# Altium integrated library CC_V1.4.IntLib: 156 symbols (part 1 of 2) (continued)
## KSZ8851SNLI-TR (continued)
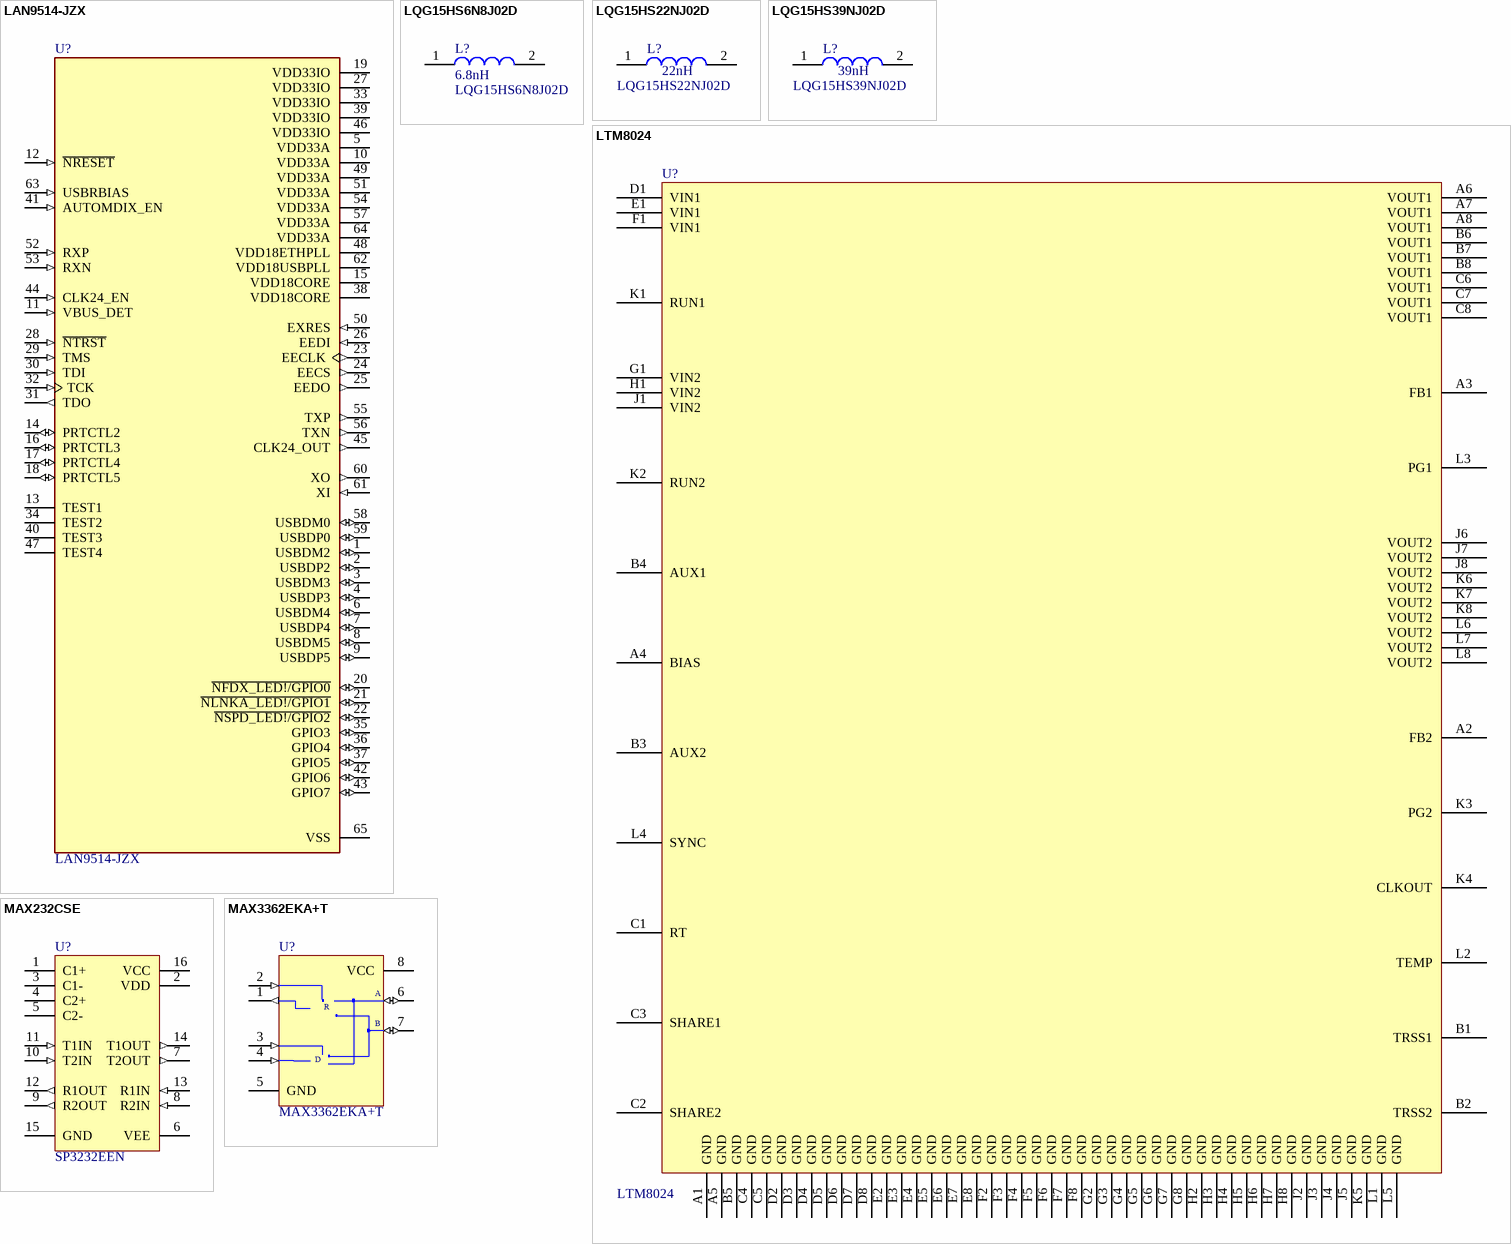
[diagram p3: symbols LAN9514-JZX to MAX3362EKA+T]

## LAN9514-JZX
designator U?
Ethernet Bridge, USB to Ethernet USB 2.0, 10/100 Base-T/TX PHY USB Interface 64-QFN _9x9_; MF: Microchip; MP: LAN9514-JZX; Availability: Unavailable; SnapEDA_Link: https://www.snapeda.com/parts/LAN9514-JZX/Microchip/view-part/105106/?ref=snap; Package: QFN-64 Microchip; Value: *; Price: None
footprint QFN50P900X900X100-65N730X730
pins: 1 USBDM2 (io), 2 USBDP2 (io), 3 USBDM3 (io), 4 USBDP3 (io), 5 VDD33A (power), 6 USBDM4 (io), 7 USBDP4 (io), 8 USBDM5 (io), 9 USBDP5 (io), 10 VDD33A (power), 11 VBUS_DET (in), 12 ~{NRESET} (in), 13 TEST1, 14 PRTCTL2 (io), 15 VDD18CORE (power), 16 PRTCTL3 (io), 17 PRTCTL4 (io), 18 PRTCTL5 (io), 19 VDD33IO (power), 20 ~{NFDX_LED!/GPIO0} (io), 21 ~{NLNKA_LED!/GPIO1} (io), 22 ~{NSPD_LED!/GPIO2} (io), 23 EECLK (out), 24 EECS (out), 25 EEDO (out), 26 EEDI (in), 27 VDD33IO (power), 28 ~{NTRST} (in), 29 TMS (in), 30 TDI (in), 31 TDO (out), 32 TCK (in), 33 VDD33IO (power), 34 TEST2, 35 GPIO3 (io), 36 GPIO4 (io), 37 GPIO5 (io), 38 VDD18CORE (power), 39 VDD33IO (power), 40 TEST3, 41 AUTOMDIX_EN (in), 42 GPIO6 (io), 43 GPIO7 (io), 44 CLK24_EN (in), 45 CLK24_OUT (out), 46 VDD33IO (power), 47 TEST4, 48 VDD18ETHPLL (power), 49 VDD33A (power), 50 EXRES (in), 51 VDD33A (power), 52 RXP (in), 53 RXN (in), 54 VDD33A (power), 55 TXP (out), 56 TXN (out), 57 VDD33A (power), 58 USBDM0 (io), 59 USBDP0 (io), 60 XO (out), 61 XI (in), 62 VDD18USBPLL (power), 63 USBRBIAS (in), 64 VDD33A (power), 65 VSS (power)

## LQG15HS6N8J02D
designator L?  value 6.8nH  (hidden comment: LQG15HS6N8J02D)
Murata Inductor; Manufacturer_Name: Murata Electronics; Height: 0.55mm; Link: https://www.digikey.com/product-detail/en/murata-electronics/LQG15HS6N8J02D/490-2621-1-ND/662901; Part Number: LQG15HS6N8J02D
footprint LQG15HN
pins: 1, 2

## LQG15HS22NJ02D
designator L?  value 22nH  (hidden comment: LQG15HS22NJ02D)
Murata Inductor; Manufacturer_Name: Murata Electronics; Height: 0.55mm; Link: https://www.digikey.com/product-detail/en/murata-electronics/LQG15HS22NJ02D/490-2627-1-ND/662907; Part Number: LQG15HS22NJ02D
footprint LQG15HN
pins: 1, 2

## LQG15HS39NJ02D
designator L?  value 39nH  (hidden comment: LQG15HS39NJ02D)
Murata Inductor; Manufacturer_Name: Murata Electronics; Height: 0.55mm; Link: https://www.digikey.com/product-detail/en/murata-electronics/LQG15HS39NJ02D/490-2630-1-ND/662910; Part Number: LQG15HS39NJ02D
footprint LQG15HN
pins: 1, 2

## LTM8024
designator U?
footprint BGA88C100P8X11_900X1125X352
pins: A1 GND, A2 FB2, A3 FB1, A4 BIAS, A5 GND, A6 VOUT1, A7 VOUT1, A8 VOUT1, B1 TRSS1, B2 TRSS2, B3 AUX2, B4 AUX1, B5 GND, B6 VOUT1, B7 VOUT1, B8 VOUT1, C1 RT, C2 SHARE2, C3 SHARE1, C4 GND, C5 GND, C6 VOUT1, C7 VOUT1, C8 VOUT1, D1 VIN1, D2 GND, D3 GND, D4 GND, D5 GND, D6 GND, D7 GND, D8 GND, E1 VIN1, E2 GND, E3 GND, E4 GND, E5 GND, E6 GND, E7 GND, E8 GND, F1 VIN1, F2 GND, F3 GND, F4 GND, F5 GND, F6 GND, F7 GND, F8 GND, G1 VIN2, G2 GND, G3 GND, G4 GND, G5 GND, G6 GND, G7 GND, G8 GND, H1 VIN2, H2 GND, H3 GND, H4 GND, H5 GND, H6 GND, H7 GND, H8 GND, J1 VIN2, J2 GND, J3 GND, J4 GND, J5 GND, J6 VOUT2, J7 VOUT2, J8 VOUT2, K1 RUN1, K2 RUN2, K3 PG2, K4 CLKOUT, K5 GND, K6 VOUT2, K7 VOUT2, K8 VOUT2, L1 GND, L2 TEMP, L3 PG1, L4 SYNC, L5 GND, L6 VOUT2, L7 VOUT2, L8 VOUT2

## MAX232CSE
designator U?, comment SP3232EEN
IC TXRX RS232 ESD TRUE 16SOIC; Published: 16-Jan-2001; LatestRevisionDate: 13-Apr-2006; LatestRevisionNote: IPC-7351 Footprint Added.; PackageReference: NSO16; Publisher: Altium Limited; PackageDescription: 16-Pin Small Outline Integrated Circuit 1.27 mm Pitch; Code_JEDEC: MS-012-AC; Code_IPC: SOIC127P600-16; ComponentLink1Description: Manufacturer Link; ComponentLink1URL: http://www.maxim-ic.com/; ComponentLink2Description: Datasheet; ComponentLink2URL: http://pdfserv.maxim-ic.com/en/ds/MAX220-MAX249.pdf
footprint SOIC16_M (SOIC, 16-Leads, Body 9.9x3.9mm, Pitch 1.27mm, IPC Low Density)
footprint NSO16_L (SOIC, 16-Leads, Body 9.9x3.9mm, Pitch 1.27mm, IPC High Density)
footprint NSO16_M (SOIC, 16-Leads, Body 9.9x3.9mm, Pitch 1.27mm, IPC Low Density)
3D model NSO16 (16-Pin Small Outline Integrated Circuit 1.27 mm Pitch)
pins: 1 C1+, 2 VDD (power), 3 C1-, 4 C2+, 5 C2-, 6 VEE (power), 7 T2OUT (out), 8 R2IN (in), 9 R2OUT (out), 10 T2IN (in), 11 T1IN (in), 12 R1OUT (out), 13 R1IN (in), 14 T1OUT (out), 15 GND (power), 16 VCC (power)

## MAX3362EKA+T
designator U?, comment Part Number: MAX3362EKA+T  (hidden comment: RS485 Transceiver)
Manufacturer_Name: Maxim Integrated; Datasheet Link: http://docs-emea.rs-online.com/webdocs/0f71/0900766b80f71b05.pdf; Height: 1.45mm; Link: https://www.digikey.sg/product-detail/en/maxim-integrated/MAX3362EKA-T/MAX3362EKA-TCT-ND/9681401
footprint SOT65P280X145-8N (SOT23)
pins: 1 RO (out), 2 ~{RE} (in), 3 DE (in), 4 DI (in), 5 GND (power), 6 A (io), 7 B (io), 8 VCC (power)
2 alternate drawings of the same symbol
text: R; D

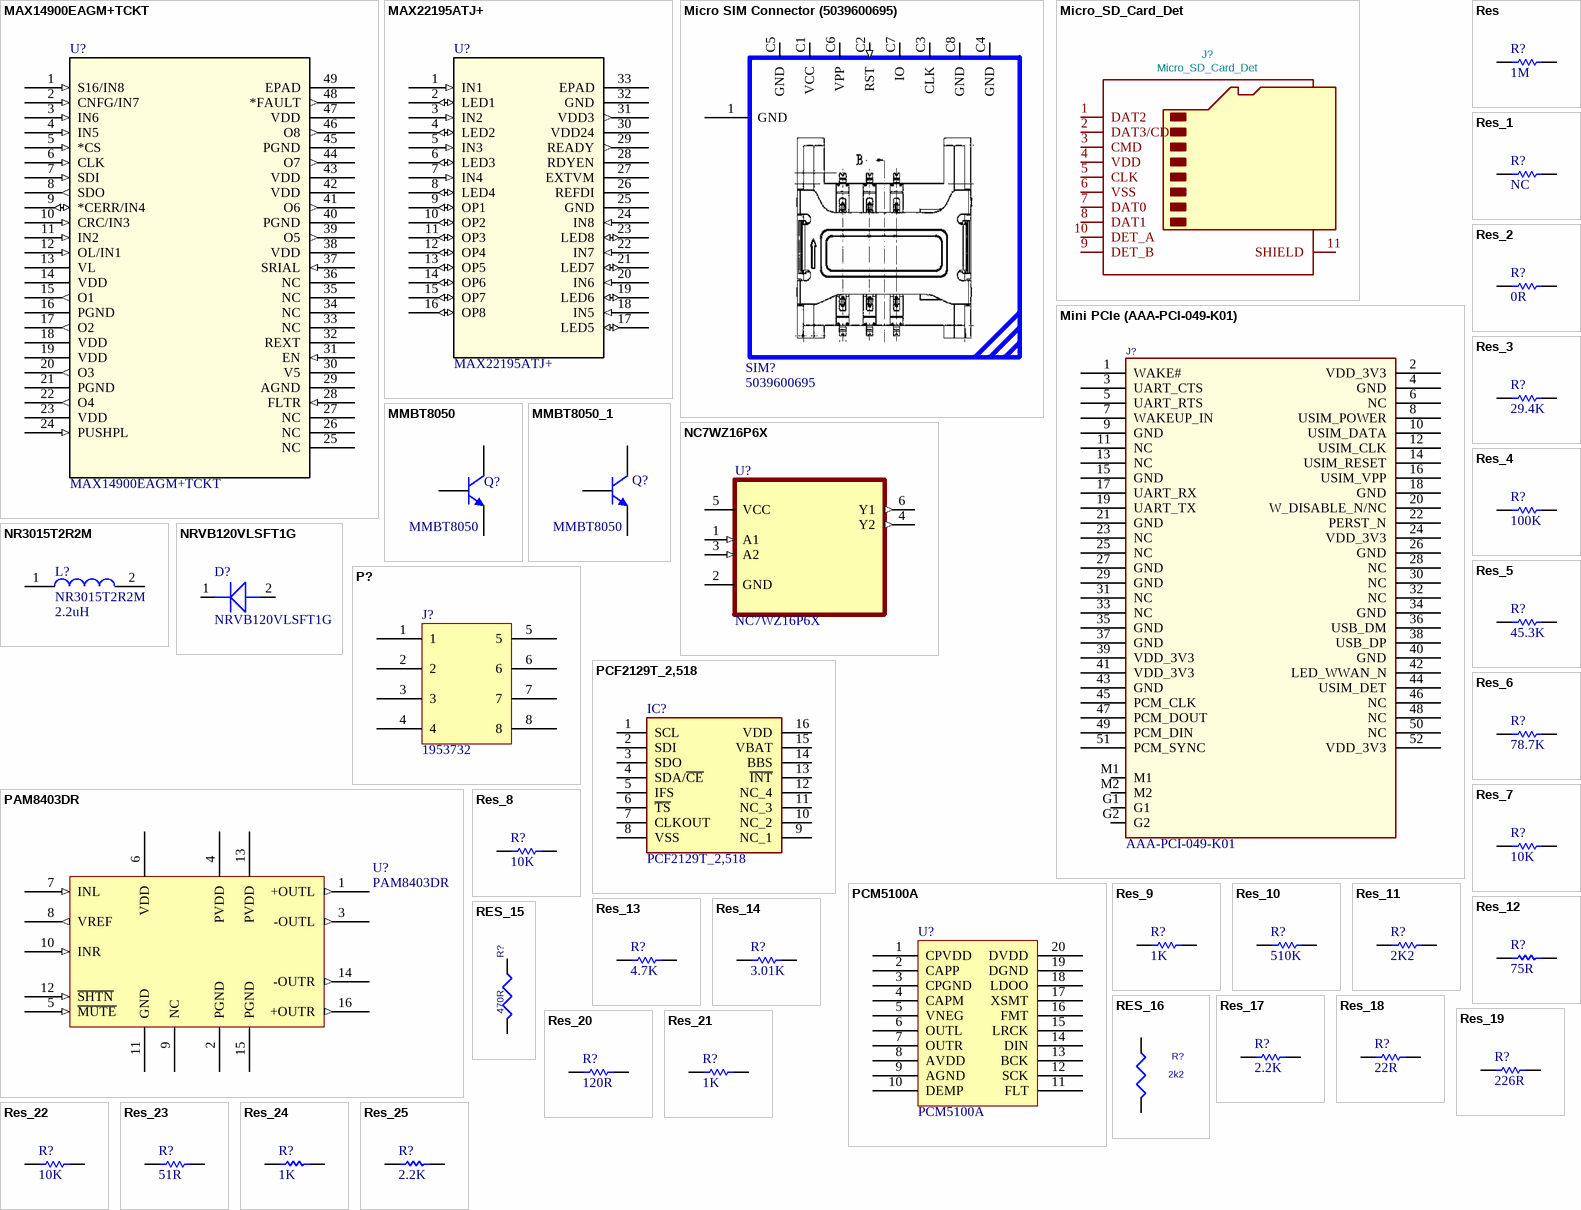
[diagram p4: symbols MAX14900EAGM+TCKT to Res_25]

## MAX14900EAGM+TCKT
designator U?
No Description Available; Vendor: Maxim Integrated Products; Built_By: EMA_UL_Team; SourceLibrary: Maxim_2017-04-18; Manufacturer_Part_Number: MAX14900EAGM+TCKT; Copyright: Copyright (C) 2018 Accelerated Designs. All rights reserved; Revision: 2; RefDes: RefDes; Type: DEV
footprint 21-100009A_K4877+1_MXM
pins: 1 S16/IN8 (in), 2 CNFG/IN7 (in), 3 IN6 (in), 4 IN5 (in), 5 *CS (in), 6 CLK (in), 7 SDI (in), 8 SDO (out), 9 *CERR/IN4 (io), 10 CRC/IN3 (in), 11 IN2 (in), 12 OL/IN1 (in), 13 VL (power), 14 VDD (power), 15 O1 (out), 16 PGND (power), 17 O2 (out), 18 VDD (power), 19 VDD (power), 20 O3 (out), 21 PGND (power), 22 O4 (out), 23 VDD (power), 24 PUSHPL (in), 25 NC, 26 NC, 27 NC, 28 FLTR (in), 29 AGND (power), 30 V5 (power), 31 EN (in), 32 REXT, 33 NC, 34 NC, 35 NC, 36 NC, 37 SRIAL (in), 38 VDD (power), 39 O5 (out), 40 PGND (power), 41 O6 (out), 42 VDD (power), 43 VDD (power), 44 O7 (out), 45 PGND (power), 46 O8 (out), 47 VDD (power), 48 *FAULT (out), 49 EPAD

## MAX22195ATJ+
designator U?
Parallel Digital Input; Built_By: EMA_UL_Team; Vendor: Maxim Integrated Products; SourceLibrary: Update_to_database_2021-06-01; Copyright: Copyright (C) 2018 Accelerated Designs. All rights reserved; Manufacturer_Part_Number: MAX22195ATJ+; Revision: 4; RefDes: RefDes; Type: DEV
footprint 21-0140_T3255+6C_MXM
pins: 1 IN1 (in), 2 LED1 (io), 3 IN2 (in), 4 LED2 (io), 5 IN3 (in), 6 LED3 (io), 7 IN4 (in), 8 LED4 (io), 9 OP1 (io), 10 OP2 (io), 11 OP3 (io), 12 OP4 (io), 13 OP5 (io), 14 OP6 (io), 15 OP7 (io), 16 OP8 (io), 17 LED5 (io), 18 IN5 (in), 19 LED6 (io), 20 IN6 (in), 21 LED7 (io), 22 IN7 (in), 23 LED8 (io), 24 IN8 (in), 25 GND, 26 REFDI, 27 EXTVM, 28 RDYEN, 29 READY (out), 30 VDD24 (power), 31 VDD3 (out), 32 GND, 33 EPAD (power)

## Micro SIM Connector (5039600695)
designator SIM?, comment Part Number: 5039600695  (hidden comment: Micro SIM Connector)
Micro SIM Card Connector; Link: https://www.digikey.sg/product-detail/en/molex/5039600695/WM17882CT-ND/8572265
footprint Micro SIM Connector (5039600695)
pins: 1 GND (power), C1 VCC (power), C2 RST (in), C3 CLK (io), C4 GND (power), C5 GND (power), C6 VPP, C7 IO (io), C8 GND (power)

## Micro_SD_Card_Det
designator J?
Part Description: 9 (8 + 1) Position Card Connector microSD™ Surface Mount, Right Angle Gold; Field4: Farnell; Field5: 2358234; Field6: 503398-1892; Field7: Molex; Field8: UCON00512; Value: Micro_SD_Card_Det; Footprint: CM4IO:SDCARD_MOLEX_503398-1892
footprint SDCARD_MOLEX_503398-1892
pins: 1 DAT2, 2 DAT3/CD, 3 CMD, 4 VDD, 5 CLK, 6 VSS, 7 DAT0, 8 DAT1, 9 DET_B, 10 DET_A, 11 SHIELD

## Mini PCIe (AAA-PCI-049-K01)
designator J?, comment Part Number: AAA-PCI-049-K01  (hidden comment: Mini PCIe)
Link: https://lcsc.com/product-detail/Others_AAA-PCI-049-K01_C185938.html
footprint MINI PCIE
pins: 1 WAKE#, 2 VDD_3V3, 3 UART_CTS, 4 GND, 5 UART_RTS, 6 NC, 7 WAKEUP_IN, 8 USIM_POWER, 9 GND, 10 USIM_DATA, 11 NC, 12 USIM_CLK, 13 NC, 14 USIM_RESET, 15 GND, 16 USIM_VPP, 17 UART_RX, 18 GND, 19 UART_TX, 20 W_DISABLE_N/NC, 21 GND, 22 PERST_N, 23 NC, 24 VDD_3V3, 25 NC, 26 GND, 27 GND, 28 NC, 29 GND, 30 NC, 31 NC, 32 NC, 33 NC, 34 GND, 35 GND, 36 USB_DM, 37 GND, 38 USB_DP, 39 VDD_3V3, 40 GND, 41 VDD_3V3, 42 LED_WWAN_N, 43 GND, 44 USIM_DET, 45 PCM_CLK, 46 NC, 47 PCM_DOUT, 48 NC, 49 PCM_DIN, 50 NC, 51 PCM_SYNC, 52 VDD_3V3, G1, G2, M1, M2

## MMBT8050
designator Q?
NPN General Purpose Amplifier; Link: https://www.alibaba.com/product-detail/100-MMBT8050-SOT-23-J3Y-S8050_60584077590.html; Part Number: MMBT8050
footprint SOT95P237X111-3N (SOT23)
pins: 1 B, 2 E, 3 C
2 alternate drawings of the same symbol

## MMBT8050_1
designator Q?, comment MMBT8050
NPN General Purpose Amplifier; Link: https://www.alibaba.com/product-detail/100-MMBT8050-SOT-23-J3Y-S8050_60584077590.html; Part Number: MMBT8050
footprint SOT95P237X111-3N (SOT23)
pins: 1 B, 2 E, 3 C

## NC7WZ16P6X
designator U?
Buffer, Non-Inverting 2 Element 1 Bit per Element Push-Pull Output SC-88 _SC-70-6_; MF: ON Semiconductor; SnapEDA_Link: https://www.snapeda.com/parts/NC7WZ16P6X/ON%20Semiconductor/view-part/1769774/?ref=snap; Availability: Unavailable; Value: *; Package: SC-70-6 ON Semiconductor; MP: NC7WZ16P6X; Price: None
footprint SOT65P210X110-6N
pins: 1 A1 (in), 2 GND, 3 A2 (in), 4 Y2 (out), 5 VCC (power), 6 Y1 (out)

## NR3015T2R2M
designator L?, comment value 2.2uH  Part Number: NR3015T2R2M  (hidden comment: Inductor)
Manufacturer_Name: TAIYO YUDEN; Datasheet Link: http://ds.yuden.co.jp/TYCOMPAS/ut/detail.do?productNo=NR3015T2R2M&fileName=NR3015T2R2M_SS&mode=specSheetDownload; Link: https://www.digikey.com/product-detail/en/taiyo-yuden/NR3015T2R2M/587-1648-1-ND/1008263
footprint NR3015T2R2M
pins: 1, 2
2 alternate drawings of the same symbol

## NRVB120VLSFT1G
designator D?, comment Part Number: NRVB120VLSFT1G  (hidden comment: Schottky Diode)
Manufacturer_Name: ON Semiconductor; Datasheet Link: http://www.onsemi.com/pub/Collateral/MBR120VLSFT1-D.PDF; Height: 0.98mm; Link: https://www.digikey.com/product-detail/en/on-semiconductor/NRVB120VLSFT1G/NRVB120VLSFT1GOSCT-ND/8538727
footprint SODFL3616X98N (SOD-123FL)
pins: 1 K, 2 A
2 alternate drawings of the same symbol

## P?
designator J?, comment 1953732
Part Number: 1953732
footprint 1953732
footprint PCBComponent_1
footprint 1953732
pins: 1, 2, 3, 4, 5, 6, 7, 8

## PAM8403DR
designator U?, comment Part Number: PAM8403DR  (hidden comment: Audio Amp)
Stereo Audio Amp; Manufacturer_Name: Diodes Inc.; Datasheet Link: http://docs-emea.rs-online.com/webdocs/1268/0900766b81268cf7.pdf; Height: 1.75mm; Link: https://www.digikey.com/product-detail/en/diodes-incorporated/PAM8403DR/PAM8403DRDICT-ND/8545951
footprint SOIC127P605X175-16N (SOIC16)
pins: 1 +OUTL (out), 2 PGND (power), 3 -OUTL (out), 4 PVDD (power), 5 ~{MUTE} (in), 6 VDD (power), 7 INL (in), 8 VREF (out), 9 NC (power), 10 INR (in), 11 GND (power), 12 ~{SHTN} (in), 13 PVDD (power), 14 -OUTR (out), 15 PGND (power), 16 +OUTR (out)
2 alternate drawings of the same symbol

## PCF2129T_2,518
designator IC?
Integrated Circuit; Manufacturer_Name: NXP; Manufacturer_Part_Number: PCF2129T/2,518; Datasheet Link: http://www.nxp.com/docs/en/data-sheet/PCF2129.pdf; Height: 2.65mm; Mouser Part Number: 771-PCF2129T/2,518; Mouser Price/Stock: https://www.mouser.co.uk/ProductDetail/NXP-Semiconductors/PCF2129T-2518/?qs=O0BhuZj9Wkzo98h9NloC7Q%3D%3D; Arrow Part Number: PCF2129T/2,518; Arrow Price/Stock: https://www.arrow.com/en/products/pcf2129t2518/nxp-semiconductors
footprint SOIC127P1032X265-16N
footprint SOIC127P1032X265-16N
pins: 1 SCL, 2 SDI, 3 SDO, 4 SDA/~{CE}, 5 IFS, 6 ~{TS}, 7 CLKOUT, 8 VSS, 9 NC_1, 10 NC_2, 11 NC_3, 12 NC_4, 13 ~{INT}, 14 BBS, 15 VBAT, 16 VDD

## PCM5100A
designator U?
footprint SOP65P640X120-20N
pins: 1 CPVDD, 2 CAPP, 3 CPGND, 4 CAPM, 5 VNEG, 6 OUTL, 7 OUTR, 8 AVDD, 9 AGND, 10 DEMP, 11 FLT, 12 SCK, 13 BCK, 14 DIN, 15 LRCK, 16 FMT, 17 XSMT, 18 LDOO, 19 DGND, 20 DVDD

## Res
designator R?  value 1M  (hidden comment: Res)
SMD resistor; Tolerance: 5%
footprint RES (1206) (Chip Resistor, 2-Leads, Body 3.2x1.6mm, IPC High Density _ (0.125 W))
footprint RES (0805) (Chip Resistor, 2-Leads, Body 2.0x1.3mm, IPC High Density _ (0.100 W))
footprint RES 0603
footprint RES (0402) (Chip Resistor, 2-Leads, Body 1.0x0.5mm, IPC High Density _ (0.031/0.063 W))
footprint RES (0201) (Chip Resistor, 2-Leads, Body 0.6x0.3mm, IPC High Density (0.05 W))
footprint RES (2512) (Chip Resistor, 2-Leads, Body 6.3x3.1mm, IPC High Density _ (0.500 W))
pins: 1, 2

## Res_1
designator R?, comment value NC  (hidden comment: Res)
SMD resistor; Tolerance: 5%
footprint RES (1206) (Chip Resistor, 2-Leads, Body 3.2x1.6mm, IPC High Density _ (0.125 W))
footprint RES (0805) (Chip Resistor, 2-Leads, Body 2.0x1.3mm, IPC High Density _ (0.100 W))
footprint RES (0603)
footprint RES (0402) (Chip Resistor, 2-Leads, Body 1.0x0.5mm, IPC High Density _ (0.031/0.063 W))
footprint RES (0201) (Chip Resistor, 2-Leads, Body 0.6x0.3mm, IPC High Density (0.05 W))
footprint RES (2512) (Chip Resistor, 2-Leads, Body 6.3x3.1mm, IPC High Density _ (0.500 W))
pins: 1, 2

## Res_2
designator R?, comment value 0R  (hidden comment: Res)
SMD resistor; Tolerance: 5%
footprint RES (1206) (Chip Resistor, 2-Leads, Body 3.2x1.6mm, IPC High Density _ (0.125 W))
footprint RES (0805) (Chip Resistor, 2-Leads, Body 2.0x1.3mm, IPC High Density _ (0.100 W))
footprint RES (0603)
footprint RES (0402) (Chip Resistor, 2-Leads, Body 1.0x0.5mm, IPC High Density _ (0.031/0.063 W))
footprint RES (0201) (Chip Resistor, 2-Leads, Body 0.6x0.3mm, IPC High Density (0.05 W))
footprint RES (2512) (Chip Resistor, 2-Leads, Body 6.3x3.1mm, IPC High Density _ (0.500 W))
pins: 1, 2

## Res_3
designator R?, comment value 29.4K  (hidden comment: Res)
SMD resistor; Tolerance: 5%
footprint RES (1206) (Chip Resistor, 2-Leads, Body 3.2x1.6mm, IPC High Density _ (0.125 W))
footprint RES (0805) (Chip Resistor, 2-Leads, Body 2.0x1.3mm, IPC High Density _ (0.100 W))
footprint RES (0603)
footprint RES (0402) (Chip Resistor, 2-Leads, Body 1.0x0.5mm, IPC High Density _ (0.031/0.063 W))
footprint RES (0201) (Chip Resistor, 2-Leads, Body 0.6x0.3mm, IPC High Density (0.05 W))
footprint RES (2512) (Chip Resistor, 2-Leads, Body 6.3x3.1mm, IPC High Density _ (0.500 W))
pins: 1, 2

## Res_4
designator R?, comment value 100K  (hidden comment: Res)
SMD resistor; Tolerance: 5%
footprint RES (1206) (Chip Resistor, 2-Leads, Body 3.2x1.6mm, IPC High Density _ (0.125 W))
footprint RES (0805) (Chip Resistor, 2-Leads, Body 2.0x1.3mm, IPC High Density _ (0.100 W))
footprint RES (0603)
footprint RES (0402) (Chip Resistor, 2-Leads, Body 1.0x0.5mm, IPC High Density _ (0.031/0.063 W))
footprint RES (0201) (Chip Resistor, 2-Leads, Body 0.6x0.3mm, IPC High Density (0.05 W))
footprint RES (2512) (Chip Resistor, 2-Leads, Body 6.3x3.1mm, IPC High Density _ (0.500 W))
pins: 1, 2

## Res_5
designator R?, comment value 45.3K  (hidden comment: Res)
SMD resistor; Tolerance: 5%
footprint RES (1206) (Chip Resistor, 2-Leads, Body 3.2x1.6mm, IPC High Density _ (0.125 W))
footprint RES (0805) (Chip Resistor, 2-Leads, Body 2.0x1.3mm, IPC High Density _ (0.100 W))
footprint RES (0603)
footprint RES (0402) (Chip Resistor, 2-Leads, Body 1.0x0.5mm, IPC High Density _ (0.031/0.063 W))
footprint RES (0201) (Chip Resistor, 2-Leads, Body 0.6x0.3mm, IPC High Density (0.05 W))
footprint RES (2512) (Chip Resistor, 2-Leads, Body 6.3x3.1mm, IPC High Density _ (0.500 W))
pins: 1, 2

## Res_6
designator R?, comment value 78.7K  (hidden comment: Res)
SMD resistor; Tolerance: 5%
footprint RES (1206) (Chip Resistor, 2-Leads, Body 3.2x1.6mm, IPC High Density _ (0.125 W))
footprint RES (0805) (Chip Resistor, 2-Leads, Body 2.0x1.3mm, IPC High Density _ (0.100 W))
footprint RES (0603)
footprint RES (0402) (Chip Resistor, 2-Leads, Body 1.0x0.5mm, IPC High Density _ (0.031/0.063 W))
footprint RES (0201) (Chip Resistor, 2-Leads, Body 0.6x0.3mm, IPC High Density (0.05 W))
footprint RES (2512) (Chip Resistor, 2-Leads, Body 6.3x3.1mm, IPC High Density _ (0.500 W))
pins: 1, 2

## Res_7
designator R?, comment value 10K  (hidden comment: Res)
SMD resistor; Tolerance: 5%
footprint RES (1206) (Chip Resistor, 2-Leads, Body 3.2x1.6mm, IPC High Density _ (0.125 W))
footprint RES (0805) (Chip Resistor, 2-Leads, Body 2.0x1.3mm, IPC High Density _ (0.100 W))
footprint RES (0603)
footprint RES (0402) (Chip Resistor, 2-Leads, Body 1.0x0.5mm, IPC High Density _ (0.031/0.063 W))
footprint RES (0201) (Chip Resistor, 2-Leads, Body 0.6x0.3mm, IPC High Density (0.05 W))
footprint RES (2512) (Chip Resistor, 2-Leads, Body 6.3x3.1mm, IPC High Density _ (0.500 W))
pins: 1, 2

## Res_8
designator R?, comment value 10K  (hidden comment: Res)
Resistor; Published: 8-Jun-2000; LatestRevisionDate: 17-Jul-2002; LatestRevisionNote: Re-released for DXP Platform.; PackageReference: AXIAL-0.3; Publisher: Altium Limited
footprint AXIAL-0.3 (Resistor; 2 Leads)
simulation model RESISTOR (Resistor)
signal-integrity model Res
footprint RES 0805 (2012X06L) (Chip Capacitor; Body 2.0 x 1.2 mm (LxW typ))
footprint 1206 (Chip Resistor; Body 3.2 x 1.6 mm (LxW typ))
footprint C 0805
footprint R0603
pins: 1, 2

## Res_9
designator R?, comment value 1K  (hidden comment: Res)
Resistor; Published: 8-Jun-2000; LatestRevisionDate: 17-Jul-2002; LatestRevisionNote: Re-released for DXP Platform.; PackageReference: AXIAL-0.3; Publisher: Altium Limited
footprint AXIAL-0.3 (Resistor; 2 Leads)
simulation model RESISTOR (Resistor)
signal-integrity model Res
footprint RES 0805 (2012X06L) (Chip Capacitor; Body 2.0 x 1.2 mm (LxW typ))
footprint 1206 (Chip Resistor; Body 3.2 x 1.6 mm (LxW typ))
footprint R0603
pins: 1, 2

## Res_10
designator R?, comment value 510K  (hidden comment: Res)
SMD resistor; Tolerance: 1%
footprint RES (1206) (Chip Resistor, 2-Leads, Body 3.2x1.6mm, IPC High Density _ (0.125 W))
footprint RES (0805) (Chip Resistor, 2-Leads, Body 2.0x1.3mm, IPC High Density _ (0.100 W))
footprint RES (0603)
footprint RES (0402) (Chip Resistor, 2-Leads, Body 1.0x0.5mm, IPC High Density _ (0.031/0.063 W))
footprint RES (0201) (Chip Resistor, 2-Leads, Body 0.6x0.3mm, IPC High Density (0.05 W))
footprint RES (2512) (Chip Resistor, 2-Leads, Body 6.3x3.1mm, IPC High Density _ (0.500 W))
pins: 1, 2

## Res_11
designator R?, comment value 2K2  (hidden comment: Res)
SMD resistor; Tolerance: 5%
footprint RES (1206) (Chip Resistor, 2-Leads, Body 3.2x1.6mm, IPC High Density _ (0.125 W))
footprint RES (0805) (Chip Resistor, 2-Leads, Body 2.0x1.3mm, IPC High Density _ (0.100 W))
footprint RES 0603
footprint RES (0402) (Chip Resistor, 2-Leads, Body 1.0x0.5mm, IPC High Density _ (0.031/0.063 W))
footprint RES (0201) (Chip Resistor, 2-Leads, Body 0.6x0.3mm, IPC High Density (0.05 W))
footprint RES (2512) (Chip Resistor, 2-Leads, Body 6.3x3.1mm, IPC High Density _ (0.500 W))
footprint RES 0603
footprint RES 0603
pins: 1, 2

## Res_12
designator R?, comment value 75R  (hidden comment: Res)
SMD resistor; Tolerance: 5%
footprint RES (1206)
footprint RES (0805)
footprint RES (0603)
footprint RES (0402)
pins: 1, 2
2 alternate drawings of the same symbol

## Res_13
designator R?, comment value 4.7K  (hidden comment: Res)
Resistor; Published: 8-Jun-2000; LatestRevisionDate: 17-Jul-2002; LatestRevisionNote: Re-released for DXP Platform.; PackageReference: AXIAL-0.3; Publisher: Altium Limited
footprint AXIAL-0.3 (Resistor; 2 Leads)
simulation model RESISTOR (Resistor)
signal-integrity model Res
footprint RES 0805 (2012X06L) (Chip Capacitor; Body 2.0 x 1.2 mm (LxW typ))
footprint 1206 (Chip Resistor; Body 3.2 x 1.6 mm (LxW typ))
footprint C 0805
footprint R0603
pins: 1, 2

## Res_14
designator R?, comment value 3.01K  (hidden comment: Res)
Resistor; Published: 8-Jun-2000; LatestRevisionDate: 17-Jul-2002; LatestRevisionNote: Re-released for DXP Platform.; PackageReference: AXIAL-0.3; Publisher: Altium Limited
footprint AXIAL-0.3 (Resistor; 2 Leads)
simulation model RESISTOR (Resistor)
signal-integrity model Res
footprint RES 0805 (2012X06L) (Chip Capacitor; Body 2.0 x 1.2 mm (LxW typ))
footprint 1206 (Chip Resistor; Body 3.2 x 1.6 mm (LxW typ))
footprint C 0805
footprint R0603
pins: 1, 2

## RES_15
designator R?, comment 470R
Value: 470
footprint R0603
pins: 1, 2

## RES_16
designator R?, comment 2k2
Value: 470
footprint R0603
pins: 1, 2

## Res_17
designator R?, comment value 2.2K  (hidden comment: Res)
Resistor; Published: 8-Jun-2000; LatestRevisionDate: 17-Jul-2002; LatestRevisionNote: Re-released for DXP Platform.; PackageReference: AXIAL-0.3; Publisher: Altium Limited
footprint AXIAL-0.3 (Resistor; 2 Leads)
simulation model RESISTOR (Resistor)
signal-integrity model Res
footprint RES 0805 (2012X06L) (Chip Capacitor; Body 2.0 x 1.2 mm (LxW typ))
footprint 1206 (Chip Resistor; Body 3.2 x 1.6 mm (LxW typ))
footprint R0603
pins: 1, 2

## Res_18
designator R?, comment value 22R  (hidden comment: Res)
Resistor; Published: 8-Jun-2000; LatestRevisionDate: 17-Jul-2002; LatestRevisionNote: Re-released for DXP Platform.; PackageReference: AXIAL-0.3; Publisher: Altium Limited
footprint AXIAL-0.3 (Resistor; 2 Leads)
simulation model RESISTOR (Resistor)
signal-integrity model Res
footprint RES 0805 (2012X06L) (Chip Capacitor; Body 2.0 x 1.2 mm (LxW typ))
footprint 1206 (Chip Resistor; Body 3.2 x 1.6 mm (LxW typ))
footprint R0603
pins: 1, 2

## Res_19
designator R?, comment value 226R  (hidden comment: Res)
Resistor; Published: 8-Jun-2000; LatestRevisionDate: 17-Jul-2002; LatestRevisionNote: Re-released for DXP Platform.; PackageReference: AXIAL-0.3; Publisher: Altium Limited
footprint AXIAL-0.3 (Resistor; 2 Leads)
simulation model RESISTOR (Resistor)
signal-integrity model Res
footprint RES 0805 (2012X06L) (Chip Capacitor; Body 2.0 x 1.2 mm (LxW typ))
footprint 1206 (Chip Resistor; Body 3.2 x 1.6 mm (LxW typ))
footprint R0603
pins: 1, 2

## Res_20
designator R?, comment value 120R  (hidden comment: Res)
Resistor; Published: 8-Jun-2000; LatestRevisionDate: 17-Jul-2002; LatestRevisionNote: Re-released for DXP Platform.; PackageReference: AXIAL-0.3; Publisher: Altium Limited
footprint AXIAL-0.3 (Resistor; 2 Leads)
simulation model RESISTOR (Resistor)
signal-integrity model Res
footprint RES 0805 (2012X06L) (Chip Capacitor; Body 2.0 x 1.2 mm (LxW typ))
footprint 1206 (Chip Resistor; Body 3.2 x 1.6 mm (LxW typ))
footprint R0603
pins: 1, 2

## Res_21
designator R?, comment value 1K  (hidden comment: Res)
Resistor; Published: 8-Jun-2000; LatestRevisionDate: 17-Jul-2002; LatestRevisionNote: Re-released for DXP Platform.; PackageReference: AXIAL-0.3; Publisher: Altium Limited
footprint AXIAL-0.3 (Resistor; 2 Leads)
simulation model RESISTOR (Resistor)
signal-integrity model Res
footprint RES 0805 (2012X06L) (Chip Capacitor; Body 2.0 x 1.2 mm (LxW typ))
footprint 1206 (Chip Resistor; Body 3.2 x 1.6 mm (LxW typ))
footprint C 0805
footprint R0603
pins: 1, 2

## Res_22
designator R?, comment value 10K  (hidden comment: Res)
Resistor; Published: 8-Jun-2000; LatestRevisionDate: 17-Jul-2002; LatestRevisionNote: Re-released for DXP Platform.; PackageReference: AXIAL-0.3; Publisher: Altium Limited
footprint AXIAL-0.3 (Resistor; 2 Leads)
simulation model RESISTOR (Resistor)
signal-integrity model Res
footprint RES 0805 (2012X06L) (Chip Capacitor; Body 2.0 x 1.2 mm (LxW typ))
footprint 1206 (Chip Resistor; Body 3.2 x 1.6 mm (LxW typ))
footprint R0603
pins: 1, 2

## Res_23
designator R?, comment 51R
SMD resistor; Tolerance: 5%; Value: 51r
footprint RES (1206) (Chip Resistor, 2-Leads, Body 3.2x1.6mm, IPC High Density _ (0.125 W))
footprint RES (0805) (Chip Resistor, 2-Leads, Body 2.0x1.3mm, IPC High Density _ (0.100 W))
footprint RES 0603
footprint RES (0402) (Chip Resistor, 2-Leads, Body 1.0x0.5mm, IPC High Density _ (0.031/0.063 W))
footprint RES (0201) (Chip Resistor, 2-Leads, Body 0.6x0.3mm, IPC High Density (0.05 W))
pins: 1, 2

## Res_24
designator R?, comment value 1K  (hidden comment: Res)
SMD resistor; Tolerance: 5%
footprint RES (1206)
footprint RES (0805)
footprint RES (0603)
footprint RES (0402)
pins: 1, 2
2 alternate drawings of the same symbol

## Res_25
designator R?, comment value 2.2K  (hidden comment: Res)
SMD resistor; Tolerance: 5%
footprint RES (1206)
footprint RES (0805)
footprint RES (0603)
footprint RES (0402)
pins: 1, 2
2 alternate drawings of the same symbol

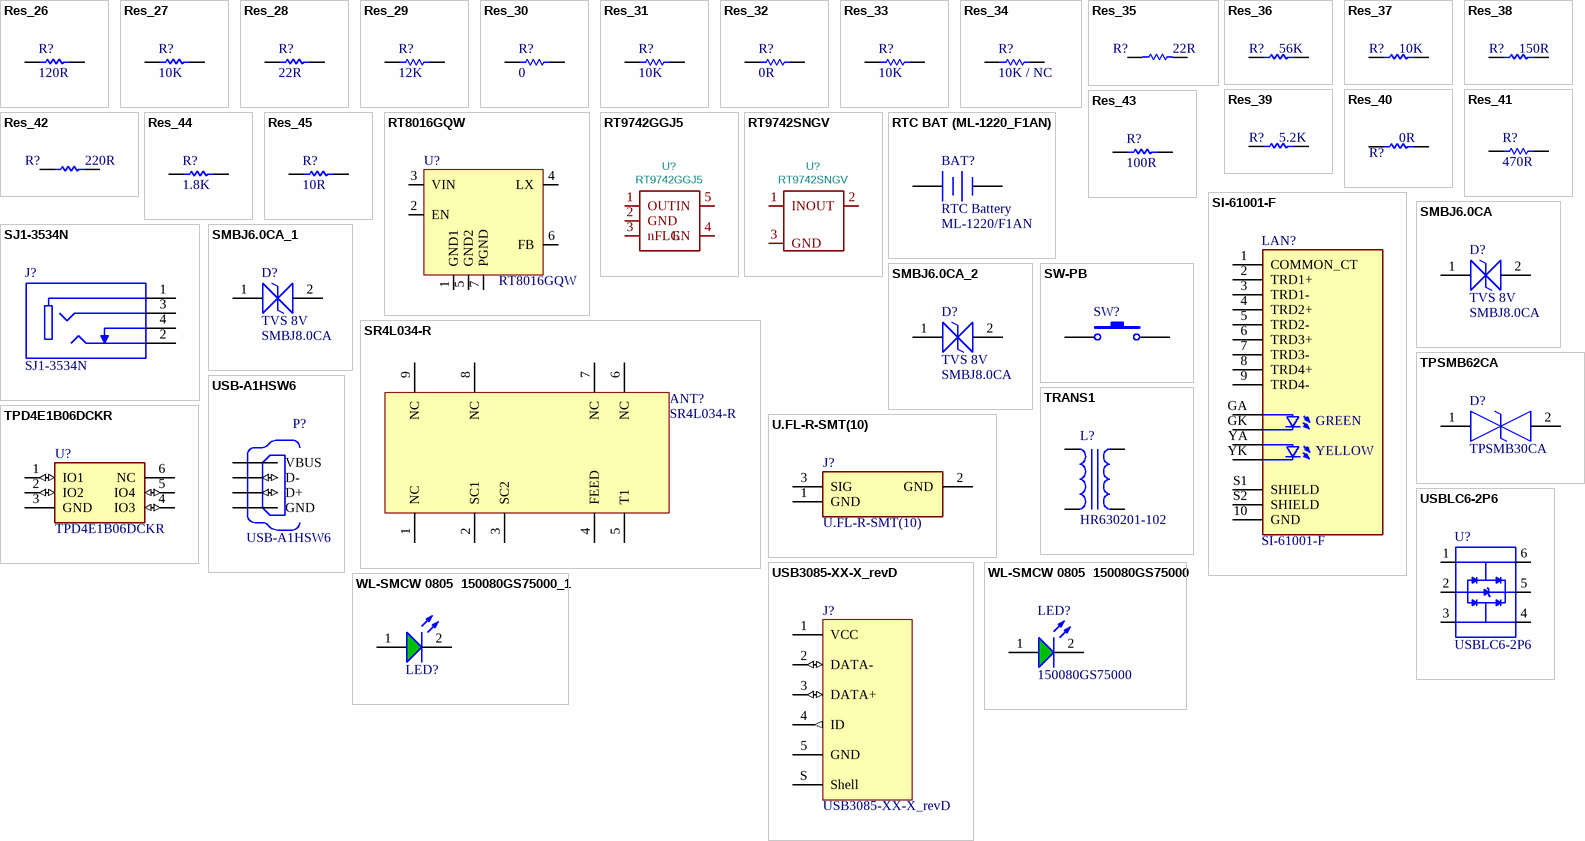
[diagram p5: symbols Res_26 to WL-SMCW 0805  150080GS75000_1]

## Res_26
designator R?, comment value 120R  (hidden comment: Res)
SMD resistor; Tolerance: 5%
footprint RES (1206)
footprint RES (0805)
footprint RES (0603)
footprint RES (0402)
pins: 1, 2
2 alternate drawings of the same symbol

## Res_27
designator R?, comment value 10K  (hidden comment: Res)
SMD resistor; Tolerance: 5%
footprint RES (1206)
footprint RES (0805)
footprint RES (0603)
footprint RES (0402)
pins: 1, 2
2 alternate drawings of the same symbol

## Res_28
designator R?, comment value 22R  (hidden comment: Res)
SMD resistor; Tolerance: 5%
footprint RES (1206)
footprint RES (0805)
footprint RES (0603)
footprint RES (0402)
pins: 1, 2
2 alternate drawings of the same symbol

## Res_29
designator R?, comment value 12K  (hidden comment: Res)
Resistor; Published: 8-Jun-2000; LatestRevisionDate: 17-Jul-2002; LatestRevisionNote: Re-released for DXP Platform.; PackageReference: AXIAL-0.3; Publisher: Altium Limited
footprint AXIAL-0.3 (Resistor; 2 Leads)
simulation model RESISTOR (Resistor)
signal-integrity model Res
footprint RES 0805 (2012X06L) (Chip Capacitor; Body 2.0 x 1.2 mm (LxW typ))
footprint 1206 (Chip Resistor; Body 3.2 x 1.6 mm (LxW typ))
footprint R0603
pins: 1, 2

## Res_30
designator R?, comment value 0  (hidden comment: Res)
Resistor; Published: 8-Jun-2000; LatestRevisionDate: 17-Jul-2002; LatestRevisionNote: Re-released for DXP Platform.; PackageReference: AXIAL-0.3; Publisher: Altium Limited
footprint AXIAL-0.3 (Resistor; 2 Leads)
simulation model RESISTOR (Resistor)
signal-integrity model Res
footprint RES 0805 (2012X06L) (Chip Capacitor; Body 2.0 x 1.2 mm (LxW typ))
footprint 1206 (Chip Resistor; Body 3.2 x 1.6 mm (LxW typ))
footprint C 0805
footprint R0603
pins: 1, 2

## Res_31
designator R?, comment value 10K  (hidden comment: Res)
Resistor; Published: 8-Jun-2000; LatestRevisionDate: 17-Jul-2002; LatestRevisionNote: Re-released for DXP Platform.; PackageReference: AXIAL-0.3; Publisher: Altium Limited
footprint AXIAL-0.3 (Resistor; 2 Leads)
simulation model RESISTOR (Resistor)
signal-integrity model Res
footprint RES 0805 (2012X06L) (Chip Capacitor; Body 2.0 x 1.2 mm (LxW typ))
footprint 1206 (Chip Resistor; Body 3.2 x 1.6 mm (LxW typ))
footprint C 0805
footprint R0603
pins: 1, 2

## Res_32
designator R?, comment value 0R  (hidden comment: Res)
SMD resistor; Tolerance: 5%
footprint RES (1206) (Chip Resistor, 2-Leads, Body 3.2x1.6mm, IPC High Density _ (0.125 W))
footprint RES (0805) (Chip Resistor, 2-Leads, Body 2.0x1.3mm, IPC High Density _ (0.100 W))
footprint RES (0603) (Chip Resistor, 2-Leads, Body 1.6x0.8mm, IPC High Density _ (0.063W))
footprint RES (0402) (Chip Resistor, 2-Leads, Body 1.0x0.5mm, IPC High Density _ (0.031/0.063 W))
footprint RES (0201) (Chip Resistor, 2-Leads, Body 0.6x0.3mm, IPC High Density (0.05 W))
pins: 1, 2

## Res_33
designator R?, comment value 10K  (hidden comment: Res)
SMD resistor; Tolerance: 5%
footprint RES (1206) (Chip Resistor, 2-Leads, Body 3.2x1.6mm, IPC High Density _ (0.125 W))
footprint RES (0805) (Chip Resistor, 2-Leads, Body 2.0x1.3mm, IPC High Density _ (0.100 W))
footprint RES (0603) (Chip Resistor, 2-Leads, Body 1.6x0.8mm, IPC High Density _ (0.063W))
footprint RES (0402) (Chip Resistor, 2-Leads, Body 1.0x0.5mm, IPC High Density _ (0.031/0.063 W))
footprint RES (0201) (Chip Resistor, 2-Leads, Body 0.6x0.3mm, IPC High Density (0.05 W))
pins: 1, 2

## Res_34
designator R?, comment value 10K / NC  (hidden comment: Res)
SMD resistor; Tolerance: 5%
footprint RES (1206) (Chip Resistor, 2-Leads, Body 3.2x1.6mm, IPC High Density _ (0.125 W))
footprint RES (0805) (Chip Resistor, 2-Leads, Body 2.0x1.3mm, IPC High Density _ (0.100 W))
footprint RES (0603) (Chip Resistor, 2-Leads, Body 1.6x0.8mm, IPC High Density _ (0.063W))
footprint RES (0402) (Chip Resistor, 2-Leads, Body 1.0x0.5mm, IPC High Density _ (0.031/0.063 W))
footprint RES (0201) (Chip Resistor, 2-Leads, Body 0.6x0.3mm, IPC High Density (0.05 W))
pins: 1, 2

## Res_35
designator R?, comment value 22R  (hidden comment: Res)
SMD resistor; Tolerance: 5%
footprint RES (1206) (Chip Resistor, 2-Leads, Body 3.2x1.6mm, IPC High Density _ (0.125 W))
footprint RES (0805) (Chip Resistor, 2-Leads, Body 2.0x1.3mm, IPC High Density _ (0.100 W))
footprint RES (0603) (Chip Resistor, 2-Leads, Body 1.6x0.8mm, IPC High Density _ (0.063W))
footprint RES (0402) (Chip Resistor, 2-Leads, Body 1.0x0.5mm, IPC High Density _ (0.031/0.063 W))
footprint RES (0201) (Chip Resistor, 2-Leads, Body 0.6x0.3mm, IPC High Density (0.05 W))
pins: 1, 2

## Res_36
designator R?, comment value 56K  (hidden comment: Res)
SMD resistor; Tolerance: 5%
footprint RES (1206)
footprint RES (0805)
footprint RES (0603)
footprint RES (0402)
pins: 1, 2
2 alternate drawings of the same symbol

## Res_37
designator R?, comment value 10K  (hidden comment: Res)
SMD resistor; Tolerance: 5%
footprint RES (1206)
footprint RES (0805)
footprint RES (0603)
footprint RES (0402)
pins: 1, 2
2 alternate drawings of the same symbol

## Res_38
designator R?, comment value 150R  (hidden comment: Res)
SMD resistor; Tolerance: 5%
footprint RES (1206)
footprint RES (0805)
footprint RES (0603)
footprint RES (0402)
pins: 1, 2
2 alternate drawings of the same symbol

## Res_39
designator R?, comment value 5.2K  (hidden comment: Res)
SMD resistor; Tolerance: 5%
footprint RES (1206)
footprint RES (0805)
footprint RES (0603)
footprint RES (0402)
pins: 1, 2
2 alternate drawings of the same symbol

## Res_40
designator R?, comment value 0R  (hidden comment: Res)
SMD resistor; Tolerance: 5%
footprint RES (1206)
footprint RES (0805)
footprint RES (0603)
footprint RES (0402)
pins: 1, 2
2 alternate drawings of the same symbol

## Res_41
designator R?, comment 470R
Resistor; Value: 470; Published: 8-Jun-2000; LatestRevisionDate: 17-Jul-2002; LatestRevisionNote: Re-released for DXP Platform.; PackageReference: AXIAL-0.3; Publisher: Altium Limited
footprint AXIAL-0.3 (Resistor; 2 Leads)
simulation model RESISTOR (Resistor)
signal-integrity model Res
footprint RES 0805 (2012X06L) (Chip Capacitor; Body 2.0 x 1.2 mm (LxW typ))
footprint 1206 (Chip Resistor; Body 3.2 x 1.6 mm (LxW typ))
footprint R0603
pins: 1, 2

## Res_42
designator R?, comment value 220R  (hidden comment: Res)
SMD resistor; Tolerance: 5%
footprint RES (1206)
footprint RES (0805)
footprint RES (0603)
footprint RES (0402)
pins: 1, 2
2 alternate drawings of the same symbol

## Res_43
designator R?, comment value 100R  (hidden comment: Res)
SMD resistor; Tolerance: 5%
footprint RES (1206)
footprint RES (0805)
footprint RES (0603)
footprint RES (0402)
pins: 1, 2
2 alternate drawings of the same symbol

## Res_44
designator R?, comment value 1.8K  (hidden comment: Res)
SMD resistor; Tolerance: 5%
footprint RES (1206)
footprint RES (0805)
footprint RES (0603)
footprint RES (0402)
pins: 1, 2
2 alternate drawings of the same symbol

## Res_45
designator R?, comment value 10R  (hidden comment: Res)
SMD resistor; Tolerance: 5%
footprint RES (1206)
footprint RES (0805)
footprint RES (0603)
footprint RES (0402)
pins: 1, 2
2 alternate drawings of the same symbol

## RT8016GQW
designator U?
Step-Down Converter; Manufacturer_Name: RICHTEK; Datasheet Link: https://componentsearchengine.com/Datasheets/2/RT8010GQW.pdf; Height: 0.8mm; Link: https://www.digikey.com/product-detail/en/richtek-usa-inc/RT8016GQW/1028-1031-1-ND/3071294; Part Number: RT8016GQW
footprint SON65P200X200X80-7N (WDFN-6L)
pins: 1 GND1, 2 EN, 3 VIN, 4 LX, 5 GND2, 6 FB, 7 PGND
2 alternate drawings of the same symbol

## RT9742GGJ5
designator U?
Part Description: Power Switch/Driver 1:1 N-Channel 1A TSOT-23-5; Field4: Farnell; Field5: 2545875; Field7: RichTek; Field8: USWI00166; Field6: RT9742GGJ5; Value: RT9742GGJ5; Footprint: Package_TO_SOT_SMD:SOT-23-5
footprint SOT-23-5
pins: 1 OUT, 2 GND, 3 nFLG, 4 EN, 5 IN

## RT9742SNGV
designator U?
Part Description: Power Switch/Driver 1:1 N-Channel 500mA SOT-23-3; Field4: Farnell; Field5: 2575555; Field7: RichTek; Field8: USWI00155; Field6: RT9742SNGV; Value: RT9742SNGV; Footprint: Package_TO_SOT_SMD:SOT-23
footprint SOT-23
pins: 1 IN, 2 OUT, 3 GND

## RTC BAT (ML-1220_F1AN)
designator BAT?, comment RTC Battery  Part Number: ML-1220/F1AN
Manufacturer_Name: Panasonic Battery; Datasheet Link: http://media.digikey.com/pdf/Data%20Sheets/Panasonic%20Inustrial/ML_Serie.pdf; Link: https://www.digikey.com/product-detail/en/panasonic-bsg/ML-1220-F1AN/P295-ND/447504
footprint ML-1220F1AN
pins: 1 +, 2 -
2 alternate drawings of the same symbol

## SI-61001-F
designator LAN?
Conn RJ-45 RCP 8 POS 1.27mm Solder RA Thru-Hole 14 Terminal 1 Port; MF: Bel Magnetic Solutions; Value: *; MP: SI-61001-F; Price: None; Availability: Unavailable; Package: None; SnapEDA_Link: https://www.snapeda.com/parts/SI-61001-F/Bel%20Magnetic%20Solutions/view-part/4791152/?ref=snap
footprint Model Name (Footprint not found)
footprint BEL_SI-61001-F
pins: 1 COMMON_CT, 2 TRD1+, 3 TRD1-, 4 TRD2+, 5 TRD2-, 6 TRD3+, 7 TRD3-, 8 TRD4+, 9 TRD4-, 10 GND (power), GA, GK, S1 SHIELD, S2 SHIELD, YA, YK
text: GREEN; YELLOW

## SJ1-3534N
designator J?
3,5 Ð¼Ð¼, ÑÑ‚ÐµÑ€ÐµÐ¾, Ð¿Ñ€ÑÐ¼Ð¾Ð¹ ÑƒÐ³Ð¾Ð», ÑÐºÐ²Ð¾Ð·Ð½Ð¾Ðµ Ð¾Ñ‚Ð²ÐµÑ€ÑÑ‚Ð¸Ðµ, Ð°ÑƒÐ´Ð¸Ð¾Ñ€Ð°Ð·ÑŠÐµÐ¼; MF: CUI Devices; SnapEDA_Link: https://www.snapeda.com/parts/SJ1-3534N/CUI%20Devices/view-part/576149/?ref=snap; Availability: Unavailable; Value: *; Price: None; MP: SJ1-3534N; Package: None; CUI_purchase_URL: https://www.cuidevices.com/product/interconnect/connectors/audio-connectors/jacks/sj1-353xn-series?utm_source=snapeda.com&utm_medium=referral&utm_campaign=snapedaBOM
footprint CUI_SJ1-3534N
pins: 1, 2, 3, 4